# Altium footprint library heromap.PcbLib: 593 footprints (part 32 of 38)
Each footprint in its own frame and in the unit in brackets; x right, y up, seen from the top. Pads: shape width x height; smd on the part's side, far side on the other; paste and mask are expansions set on the pad; w line width, h text height; cw(c..) or ccw(c..) is an arc to the next point about the centre after c.
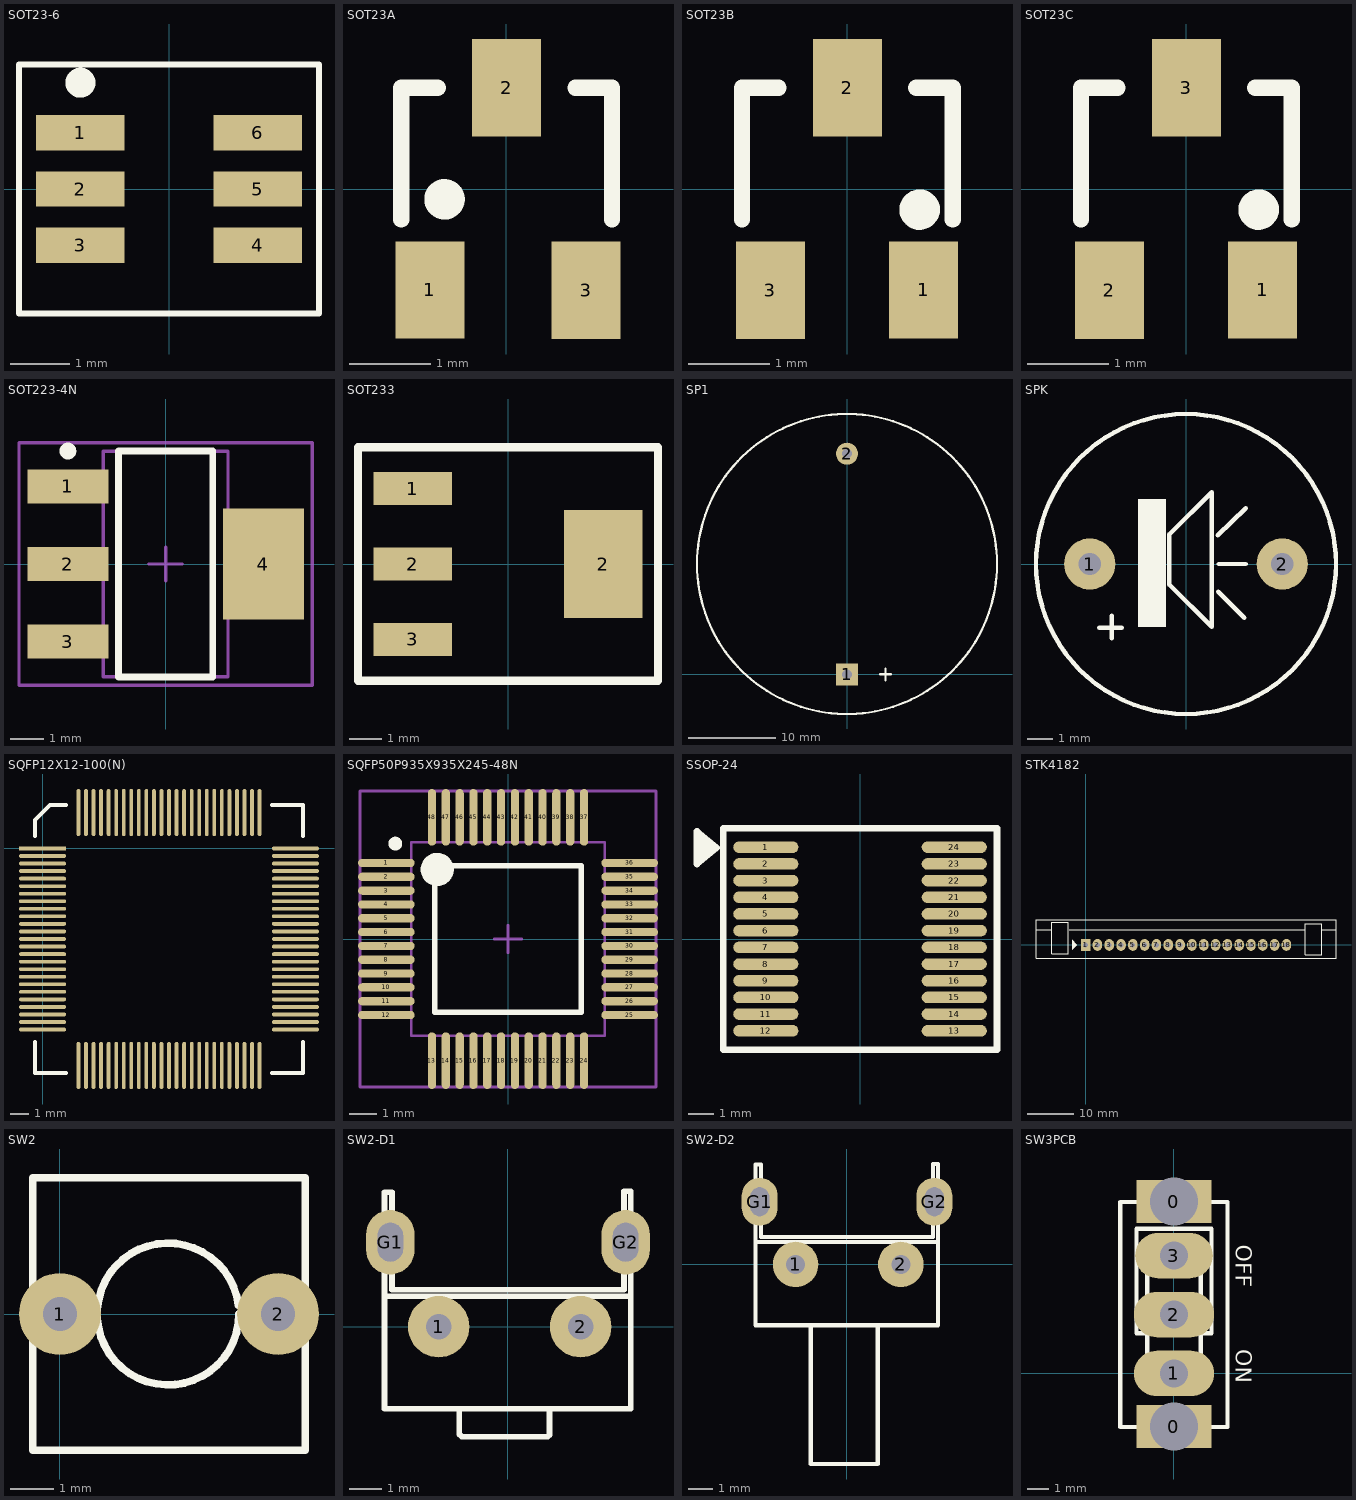
[diagram p31: the footprints below, top view; thin cyan lines are the x and y axes]

## SOT23-6 [mm] "SOT23, 5-Leads, Body 3.0x3.0mm (max), Pitch 0.95mm, IPC Medium Density"
height 1.45
pads (6):
  rect 1.5x0.6 smd: 1(-1.5,0.95) 2(-1.5,0) 3(-1.5,-0.95) 4(1.5,-0.95) 5(1.5,0) 6(1.5,0.95)
Top Overlay:
  circle w0.25: c-1.5,1.8 r0.125
  circle w0.254: c-1.5,1.8 r0.127
  lines w0.102: -2.159,2.107 1.905,2.107 ; -2.54,-2.107 2.54,-2.107 2.54,2.107 -2.54,2.107 -2.54,-2.107
3D body: height 0.15, standoff 0, extent 1.219,-0.218 1.753,0.239
3D body: height 0.9, standoff 0, extent 1.092,-0.218 1.219,0.239
3D body: height 0.9, standoff 0.75, extent 0.813,-0.218 1.092,0.239
3D body: height 0.15, standoff 0, extent -1.753,0.711 -1.219,1.168
3D body: height 0.9, standoff 0, extent -1.219,0.711 -1.092,1.168
3D body: height 0.9, standoff 0.75, extent -1.092,0.711 -0.813,1.168
3D body: height 1.45, standoff 0, extent -0.875,-1.525 0.875,1.525
3D body: height 0.9, standoff 0.75, extent -1.092,-0.239 -0.813,0.218
3D body: height 0.9, standoff 0, extent -1.219,-0.239 -1.092,0.218
3D body: height 0.15, standoff 0, extent -1.753,-0.239 -1.219,0.218
3D body: height 0.9, standoff 0.75, extent -1.092,-1.189 -0.813,-0.732
3D body: height 0.9, standoff 0, extent -1.219,-1.189 -1.092,-0.732
3D body: height 0.15, standoff 0, extent -1.753,-1.189 -1.219,-0.732
3D body: height 0.9, standoff 0.75, extent 0.813,0.732 1.092,1.189
3D body: height 0.9, standoff 0, extent 1.092,0.732 1.219,1.189
3D body: height 0.15, standoff 0, extent 1.219,0.732 1.753,1.189
3D body: height 0.9, standoff 0.75, extent 0.813,-1.168 1.092,-0.711
3D body: height 0.9, standoff 0, extent 1.092,-1.168 1.219,-0.711
3D body: height 0.15, standoff 0, extent 1.219,-1.168 1.753,-0.711

## SOT23A [mm] "SOT 23A"
height 1.27
pads (3):
  rect 0.85x1.2 smd: 1(-0.94,-1.245) 2(0.005,1.25) 3(0.985,-1.25)
Top Overlay:
  circle w0.25: c-0.76,-0.127 r0.125
  lines w0.2: -1.295,-0.375 -1.295,1.25 -0.845,1.25 ; 0.855,1.25 1.305,1.25 1.305,-0.375
3D body: height 0.15, standoff 0, extent 0.754,-1.515 1.212,-0.982
3D body: height 0.9, standoff 0, extent 0.754,-0.982 1.212,-0.855
3D body: height 0.9, standoff 0.75, extent 0.754,-0.855 1.212,-0.575
3D body: height 0.15, standoff 0, extent -1.171,-1.51 -0.714,-0.976
3D body: height 0.9, standoff 0, extent -1.171,-0.976 -0.714,-0.849
3D body: height 0.9, standoff 0.75, extent -1.171,-0.849 -0.714,-0.57
3D body: height 0.15, standoff 0, extent -0.246,0.957 0.211,1.49
3D body: height 0.9, standoff 0, extent -0.246,0.83 0.211,0.957
3D body: height 0.9, standoff 0.75, extent -0.246,0.55 0.211,0.83
3D body: height 1.27, standoff 0, extent -1.511,-0.698 1.511,0.699
3D body: height 1.27, standoff 0, extent -0.892,-0.518 -0.643,-0.269

## SOT23B [mm] "SOT 23B"
height 1.27
pads (3):
  rect 0.85x1.2 smd: 1(0.94,-1.245) 2(0,1.25) 3(-0.95,-1.25)
Top Overlay:
  circle w0.25: c0.891,-0.254 r0.125
  lines w0.2: -1.3,-0.375 -1.3,1.25 -0.85,1.25 ; 0.85,1.25 1.3,1.25 1.3,-0.375
3D body: height 1.27, standoff 0, extent -0.892,-0.518 -0.643,-0.269
3D body: height 1.27, standoff 0, extent -1.511,-0.698 1.511,0.699
3D body: height 0.9, standoff 0.75, extent -0.246,0.55 0.211,0.83
3D body: height 0.9, standoff 0, extent -0.246,0.83 0.211,0.957
3D body: height 0.15, standoff 0, extent -0.246,0.957 0.211,1.49
3D body: height 0.9, standoff 0.75, extent -1.171,-0.849 -0.714,-0.57
3D body: height 0.9, standoff 0, extent -1.171,-0.976 -0.714,-0.849
3D body: height 0.15, standoff 0, extent -1.171,-1.51 -0.714,-0.976
3D body: height 0.9, standoff 0.75, extent 0.754,-0.855 1.212,-0.575
3D body: height 0.9, standoff 0, extent 0.754,-0.982 1.212,-0.855
3D body: height 0.15, standoff 0, extent 0.754,-1.515 1.212,-0.982

## SOT23C [mm] "SOT 23C - 2-3-1 - BCE"
height 1.27
pads (3):
  rect 0.85x1.2 smd: 1(0.94,-1.245) 2(-0.95,-1.25) 3(0,1.25)
Top Overlay:
  circle w0.25: c0.891,-0.254 r0.125
  lines w0.2: -1.3,-0.375 -1.3,1.25 -0.85,1.25 ; 0.85,1.25 1.3,1.25 1.3,-0.375
3D body: height 1.27, standoff 0, extent -0.892,-0.518 -0.643,-0.269
3D body: height 1.27, standoff 0, extent -1.511,-0.698 1.511,0.699
3D body: height 0.9, standoff 0.75, extent -0.246,0.55 0.211,0.83
3D body: height 0.9, standoff 0, extent -0.246,0.83 0.211,0.957
3D body: height 0.15, standoff 0, extent -0.246,0.957 0.211,1.49
3D body: height 0.9, standoff 0.75, extent -1.171,-0.849 -0.714,-0.57
3D body: height 0.9, standoff 0, extent -1.171,-0.976 -0.714,-0.849
3D body: height 0.15, standoff 0, extent -1.171,-1.51 -0.714,-0.976
3D body: height 0.9, standoff 0.75, extent 0.754,-0.855 1.212,-0.575
3D body: height 0.9, standoff 0, extent 0.754,-0.982 1.212,-0.855
3D body: height 0.15, standoff 0, extent 0.754,-1.515 1.212,-0.982

## SOT223-4N [mm] "SOT223, 4-Leads, Body 6.5x3.5mm, Pitch 2.3mm, Lead Span 7mm, IPC Medium Density"
height 1.8
pads (4):
  rect 2.4x1 smd: 1(-2.9,2.3) 2(-2.9,0) 3(-2.9,-2.3)
  rect 2.4x3.3 smd: 4(2.9,0)
Top Overlay:
  circle w0.25: c-2.9,3.35 r0.125
  lines w0.2: -1.4,-3.35 -1.4,3.35 1.4,3.35 1.4,-3.35 -1.4,-3.35
Mechanical 13:
  lines w0.1: -1.85,-3.35 -1.85,3.35 1.85,3.35 1.85,-3.35 -1.85,-3.35
Mechanical 15:
  lines w0.1: -0.5,0 0.5,0 ; 0,-0.5 0,0.5 ; -4.35,-3.6 -4.35,3.6 4.35,3.6 4.35,-3.6 -4.35,-3.6
3D body: height 1.8, standoff 0, extent -1.85,-3.35 1.85,3.35

## SOT233 [mm]
pads (4):
  rect 2.4x1 smd: 1(-2.9,2.3) 2(-2.9,0) 3(-2.9,-2.3)
  rect 2.4x3.3 smd: 2(2.9,0)
Top Overlay:
  lines w0.254: -4.572,-3.556 4.572,-3.556 4.572,3.556 -4.572,3.556 -4.572,-3.556
3D body: height 1, standoff 0.02, extent -1.85,-3.35 1.85,3.35
3D body: height 0.4, standoff 0.15, extent -2.286,-2.807 -1.422,-1.816
3D body: height 0.4, standoff 0, extent -2.591,-2.807 -2.286,-1.816
3D body: height 0.2, standoff 0, extent -3.81,-2.807 -2.591,-1.816
3D body: height 0.4, standoff 0.15, extent -2.286,-0.495 -1.422,0.495
3D body: height 0.4, standoff 0, extent -2.591,-0.495 -2.286,0.495
3D body: height 0.2, standoff 0, extent -3.81,-0.495 -2.591,0.495
3D body: height 0.2, standoff 0, extent -3.81,1.803 -2.591,2.794
3D body: height 0.4, standoff 0, extent -2.591,1.803 -2.286,2.794
3D body: height 0.4, standoff 0.15, extent -2.286,1.803 -1.422,2.794
3D body: height 0.4, standoff 0.15, extent 1.422,-1.626 2.388,1.651
3D body: height 0.4, standoff 0, extent 2.388,-1.626 2.54,1.651
3D body: height 0.2, standoff 0, extent 2.54,-1.626 3.556,1.651

## SP1 [mil] "Speaker Telphone on Broad"
height 3
pads (2):
  rect 100x100 hole 45: 1(0,0)
  round 100 hole 45: 2(0,1000)
Top Overlay:
  circle w10: c0,500 r680
  lines w10: 150,0 200,0 ; 174,-28 174,26

## SPK [mil] "Speaker Chip"
height 500
pads (2):
  round 80 hole 35: 1(-150,0) 2(150,0)
Top Overlay:
  circle w7: c0,0 r233.73
  rectangle: -75,-98 -31,101
  lines w7: -135,-99 -100,-99 ; -116,-116 -116,-81 ; 49.52,44.52 93,87 ; 50,-43 91,-84 ; 51,0 93,0 ; -26,-32 40,-98 40,112 -26,46 -26,-32
3D body: height 11.81, standoff -94.49, extent 134.38,-15.72 165.75,15.72
3D body: height 11.81, standoff -94.49, extent -165.62,-15.71 -134.25,15.73
3D body: height 362.2, standoff 7.87, extent -214.82,-216.1 216.54,216.12
3D body: height 362.6, standoff 7.87, extent -78.11,-78.58 78.75,78.59

## SQFP12X12-100(N) [mm]
pads (100):
  rect 2.5x0.2 smd: 1(0,0)
  oval 2.5x0.2 smd: 2(0,-0.4) 3(0,-0.8) 4(0,-1.2) 5(0,-1.6) 6(0,-2) 7(0,-2.4) 8(0,-2.8) 9(0,-3.2) 10(0,-3.6) 11(0,-4) 12(0,-4.4) 13(0,-4.8) 14(0,-5.2) 15(0,-5.6) 16(0,-6) 17(0,-6.4) 18(0,-6.8) 19(0,-7.2) 20(0,-7.6) 21(0,-8) 22(0,-8.4) 23(0,-8.8) 24(0,-9.2) 25(0,-9.6) 51(13.4,-9.6) 52(13.4,-9.2) 53(13.4,-8.8) 54(13.4,-8.4) 55(13.4,-8) 56(13.4,-7.6) 57(13.4,-7.2) 58(13.4,-6.8) 59(13.4,-6.4) 60(13.4,-6) 61(13.4,-5.6) 62(13.4,-5.2) 63(13.4,-4.8) 64(13.4,-4.4) 65(13.4,-4) 66(13.4,-3.6) 67(13.4,-3.2) 68(13.4,-2.8) 69(13.4,-2.4) 70(13.4,-2) 71(13.4,-1.6) 72(13.4,-1.2) 73(13.4,-0.8) 74(13.4,-0.4) 75(13.4,0)
  oval 0.2x2.5 smd: 26(1.9,-11.5) 27(2.3,-11.5) 28(2.7,-11.5) 29(3.1,-11.5) 30(3.5,-11.5) 31(3.9,-11.5) 32(4.3,-11.5) 33(4.7,-11.5) 34(5.1,-11.5) 35(5.5,-11.5) 36(5.9,-11.5) 37(6.3,-11.5) 38(6.7,-11.5) 39(7.1,-11.5) 40(7.5,-11.5) 41(7.9,-11.5) 42(8.3,-11.5) 43(8.7,-11.5) 44(9.1,-11.5) 45(9.5,-11.5) 46(9.9,-11.5) 47(10.3,-11.5) 48(10.7,-11.5) 49(11.1,-11.5) 50(11.5,-11.5) 76(11.5,1.9) 77(11.1,1.9) 78(10.7,1.9) 79(10.3,1.9) 80(9.9,1.9) 81(9.5,1.9) 82(9.1,1.9) 83(8.7,1.9) 84(8.3,1.9) 85(7.9,1.9) 86(7.5,1.9) 87(7.1,1.9) 88(6.7,1.9) 89(6.3,1.9) 90(5.9,1.9) 91(5.5,1.9) 92(5.1,1.9) 93(4.7,1.9) 94(4.3,1.9) 95(3.9,1.9) 96(3.5,1.9) 97(3.1,1.9) 98(2.7,1.9) 99(2.3,1.9) 100(1.9,1.9)
Top Overlay:
  lines w0.2: -0.4,-10.25 -0.4,-11.9 1.25,-11.9 ; -0.4,0.65 -0.4,1.5 0.4,2.3 1.25,2.3 ; 12.15,-11.9 13.8,-11.9 13.8,-10.25 ; 12.15,2.3 13.8,2.3 13.8,0.65

## SQFP50P935X935X245-48N [mm] "SQFP, 48-Leads, Body 9,5x9,5mm (max), Pitch 0,50mm, IPC Medium Density"
height 2.45
pads (48):
  oval 2.05x0.3 smd: 1(-4.4,2.75) 2(-4.4,2.25) 3(-4.4,1.75) 4(-4.4,1.25) 5(-4.4,0.75) 6(-4.4,0.25) 7(-4.4,-0.25) 8(-4.4,-0.75) 9(-4.4,-1.25) 10(-4.4,-1.75) 11(-4.4,-2.25) 12(-4.4,-2.75) 25(4.4,-2.75) 26(4.4,-2.25) 27(4.4,-1.75) 28(4.4,-1.25) 29(4.4,-0.75) 30(4.4,-0.25) 31(4.4,0.25) 32(4.4,0.75) 33(4.4,1.25) 34(4.4,1.75) 35(4.4,2.25) 36(4.4,2.75)
  oval 0.3x2.05 smd: 13(-2.75,-4.4) 14(-2.25,-4.4) 15(-1.75,-4.4) 16(-1.25,-4.4) 17(-0.75,-4.4) 18(-0.25,-4.4) 19(0.25,-4.4) 20(0.75,-4.4) 21(1.25,-4.4) 22(1.75,-4.4) 23(2.25,-4.4) 24(2.75,-4.4) 37(2.75,4.4) 38(2.25,4.4) 39(1.75,4.4) 40(1.25,4.4) 41(0.75,4.4) 42(0.25,4.4) 43(-0.25,4.4) 44(-0.75,4.4) 45(-1.25,4.4) 46(-1.75,4.4) 47(-2.25,4.4) 48(-2.75,4.4)
Top Overlay:
  circle w0.25: c-4.075,3.45 r0.125
  circle w0.6: c-2.561,2.515 r0.3
  lines w0.2: -2.65,-2.65 -2.65,2.65 2.65,2.65 2.65,-2.65 -2.65,-2.65
Mechanical 13:
  circle w0.1: c-2.55,2.55 r0.5
  lines w0.1: -3.5,-3.5 -3.5,3.5 3.5,3.5 3.5,-3.5 -3.5,-3.5
Mechanical 15:
  lines w0.1: -0.5,0 0.5,0 ; 0,-0.5 0,0.5 ; -5.35,-5.35 -5.35,5.35 5.35,5.35 5.35,-5.35 -5.35,-5.35
3D body: height 2.45, standoff 0.25, extent -3.5,-3.5 3.5,3.5
3D body: height 0.15, standoff 0, extent -4.756,2.61 -4.044,2.89
3D body: height 1.25, standoff 1.1, extent -4.166,2.61 -3.454,2.89
3D body: height 1.25, standoff 0, extent -4.166,2.61 -4.044,2.89
3D body: height 1.25, standoff 0, extent -4.166,2.11 -4.044,2.39
3D body: height 1.25, standoff 1.1, extent -4.166,2.11 -3.454,2.39
3D body: height 0.15, standoff 0, extent -4.756,2.11 -4.044,2.39
3D body: height 1.25, standoff 0, extent -4.166,1.61 -4.044,1.89
3D body: height 1.25, standoff 1.1, extent -4.166,1.61 -3.454,1.89
3D body: height 0.15, standoff 0, extent -4.756,1.61 -4.044,1.89
3D body: height 0.15, standoff 0, extent -4.756,0.11 -4.044,0.39
3D body: height 1.25, standoff 1.1, extent -4.166,0.11 -3.454,0.39
3D body: height 1.25, standoff 0, extent -4.166,0.11 -4.044,0.39
3D body: height 0.15, standoff 0, extent -4.756,0.61 -4.044,0.89
3D body: height 1.25, standoff 1.1, extent -4.166,0.61 -3.454,0.89
3D body: height 1.25, standoff 0, extent -4.166,0.61 -4.044,0.89
3D body: height 1.25, standoff 0, extent -4.166,1.11 -4.044,1.39
3D body: height 1.25, standoff 1.1, extent -4.166,1.11 -3.454,1.39
3D body: height 0.15, standoff 0, extent -4.756,1.11 -4.044,1.39
3D body: height 0.15, standoff 0, extent -4.756,-1.39 -4.044,-1.11
3D body: height 1.25, standoff 1.1, extent -4.166,-1.39 -3.454,-1.11
3D body: height 1.25, standoff 0, extent -4.166,-1.39 -4.044,-1.11
3D body: height 0.15, standoff 0, extent -4.756,-0.89 -4.044,-0.61
3D body: height 1.25, standoff 1.1, extent -4.166,-0.89 -3.454,-0.61
3D body: height 1.25, standoff 0, extent -4.166,-0.89 -4.044,-0.61
3D body: height 1.25, standoff 0, extent -4.166,-0.39 -4.044,-0.11
3D body: height 1.25, standoff 1.1, extent -4.166,-0.39 -3.454,-0.11
3D body: height 0.15, standoff 0, extent -4.756,-0.39 -4.044,-0.11
3D body: height 0.15, standoff 0, extent -4.756,-2.89 -4.044,-2.61
3D body: height 1.25, standoff 1.1, extent -4.166,-2.89 -3.454,-2.61
3D body: height 1.25, standoff 0, extent -4.166,-2.89 -4.044,-2.61
3D body: height 0.15, standoff 0, extent -4.756,-2.39 -4.044,-2.11
3D body: height 1.25, standoff 1.1, extent -4.166,-2.39 -3.454,-2.11
3D body: height 1.25, standoff 0, extent -4.166,-2.39 -4.044,-2.11
3D body: height 1.25, standoff 0, extent -4.166,-1.89 -4.044,-1.61
3D body: height 1.25, standoff 1.1, extent -4.166,-1.89 -3.454,-1.61
3D body: height 0.15, standoff 0, extent -4.756,-1.89 -4.044,-1.61
3D body: height 0.15, standoff 0, extent 1.61,-4.756 1.89,-4.044
3D body: height 1.25, standoff 1.1, extent 1.61,-4.166 1.89,-3.454
3D body: height 1.25, standoff 0, extent 1.61,-4.166 1.89,-4.044
3D body: height 1.25, standoff 0, extent 2.11,-4.166 2.39,-4.044
3D body: height 1.25, standoff 1.1, extent 2.11,-4.166 2.39,-3.454
3D body: height 0.15, standoff 0, extent 2.11,-4.756 2.39,-4.044
3D body: height 1.25, standoff 0, extent 2.61,-4.166 2.89,-4.044
3D body: height 1.25, standoff 1.1, extent 2.61,-4.166 2.89,-3.454
3D body: height 0.15, standoff 0, extent 2.61,-4.756 2.89,-4.044
3D body: height 0.15, standoff 0, extent 0.11,-4.756 0.39,-4.044
3D body: height 1.25, standoff 1.1, extent 0.11,-4.166 0.39,-3.454
3D body: height 1.25, standoff 0, extent 0.11,-4.166 0.39,-4.044
3D body: height 1.25, standoff 0, extent 0.61,-4.166 0.89,-4.044
3D body: height 1.25, standoff 1.1, extent 0.61,-4.166 0.89,-3.454
3D body: height 0.15, standoff 0, extent 0.61,-4.756 0.89,-4.044
3D body: height 1.25, standoff 0, extent 1.11,-4.166 1.39,-4.044
3D body: height 1.25, standoff 1.1, extent 1.11,-4.166 1.39,-3.454
3D body: height 0.15, standoff 0, extent 1.11,-4.756 1.39,-4.044
3D body: height 0.15, standoff 0, extent -1.39,-4.756 -1.11,-4.044
3D body: height 1.25, standoff 1.1, extent -1.39,-4.166 -1.11,-3.454
3D body: height 1.25, standoff 0, extent -1.39,-4.166 -1.11,-4.044
3D body: height 1.25, standoff 0, extent -0.89,-4.166 -0.61,-4.044
3D body: height 1.25, standoff 1.1, extent -0.89,-4.166 -0.61,-3.454
3D body: height 0.15, standoff 0, extent -0.89,-4.756 -0.61,-4.044
3D body: height 1.25, standoff 0, extent -0.39,-4.166 -0.11,-4.044
3D body: height 1.25, standoff 1.1, extent -0.39,-4.166 -0.11,-3.454
3D body: height 0.15, standoff 0, extent -0.39,-4.756 -0.11,-4.044
3D body: height 0.15, standoff 0, extent -1.89,-4.756 -1.61,-4.044
3D body: height 1.25, standoff 1.1, extent -1.89,-4.166 -1.61,-3.454
3D body: height 1.25, standoff 0, extent -1.89,-4.166 -1.61,-4.044
3D body: height 0.15, standoff 0, extent -2.39,-4.756 -2.11,-4.044
3D body: height 1.25, standoff 1.1, extent -2.39,-4.166 -2.11,-3.454
3D body: height 1.25, standoff 0, extent -2.39,-4.166 -2.11,-4.044
3D body: height 1.25, standoff 0, extent -2.89,-4.166 -2.61,-4.044
3D body: height 1.25, standoff 1.1, extent -2.89,-4.166 -2.61,-3.454
3D body: height 0.15, standoff 0, extent -2.89,-4.756 -2.61,-4.044
3D body: height 0.15, standoff 0, extent 4.07,1.61 4.781,1.89
3D body: height 1.25, standoff 1.1, extent 3.48,1.61 4.191,1.89
3D body: height 1.25, standoff 0, extent 4.07,1.61 4.191,1.89
3D body: height 1.25, standoff 0, extent 4.07,2.11 4.191,2.39
3D body: height 1.25, standoff 1.1, extent 3.48,2.11 4.191,2.39
3D body: height 0.15, standoff 0, extent 4.07,2.11 4.781,2.39
3D body: height 1.25, standoff 0, extent 4.07,2.61 4.191,2.89
3D body: height 1.25, standoff 1.1, extent 3.48,2.61 4.191,2.89
3D body: height 0.15, standoff 0, extent 4.07,2.61 4.781,2.89
3D body: height 0.15, standoff 0, extent 4.07,0.11 4.781,0.39
3D body: height 1.25, standoff 1.1, extent 3.48,0.11 4.191,0.39
3D body: height 1.25, standoff 0, extent 4.07,0.11 4.191,0.39
3D body: height 1.25, standoff 0, extent 4.07,0.61 4.191,0.89
3D body: height 1.25, standoff 1.1, extent 3.48,0.61 4.191,0.89
3D body: height 0.15, standoff 0, extent 4.07,0.61 4.781,0.89
3D body: height 1.25, standoff 0, extent 4.07,1.11 4.191,1.39
3D body: height 1.25, standoff 1.1, extent 3.48,1.11 4.191,1.39
3D body: height 0.15, standoff 0, extent 4.07,1.11 4.781,1.39
3D body: height 0.15, standoff 0, extent 4.07,-1.39 4.781,-1.11
3D body: height 1.25, standoff 1.1, extent 3.48,-1.39 4.191,-1.11
3D body: height 1.25, standoff 0, extent 4.07,-1.39 4.191,-1.11
3D body: height 1.25, standoff 0, extent 4.07,-0.89 4.191,-0.61
3D body: height 1.25, standoff 1.1, extent 3.48,-0.89 4.191,-0.61
3D body: height 0.15, standoff 0, extent 4.07,-0.89 4.781,-0.61
3D body: height 1.25, standoff 0, extent 4.07,-0.39 4.191,-0.11
3D body: height 1.25, standoff 1.1, extent 3.48,-0.39 4.191,-0.11
3D body: height 0.15, standoff 0, extent 4.07,-0.39 4.781,-0.11
3D body: height 0.15, standoff 0, extent 4.07,-1.89 4.781,-1.61
3D body: height 1.25, standoff 1.1, extent 3.48,-1.89 4.191,-1.61
3D body: height 1.25, standoff 0, extent 4.07,-1.89 4.191,-1.61
3D body: height 0.15, standoff 0, extent 4.07,-2.39 4.781,-2.11
3D body: height 1.25, standoff 1.1, extent 3.48,-2.39 4.191,-2.11
3D body: height 1.25, standoff 0, extent 4.07,-2.39 4.191,-2.11
3D body: height 1.25, standoff 0, extent 4.07,-2.89 4.191,-2.61
3D body: height 1.25, standoff 1.1, extent 3.48,-2.89 4.191,-2.61
3D body: height 0.15, standoff 0, extent 4.07,-2.89 4.781,-2.61
3D body: height 0.15, standoff 0, extent -1.896,4.09 -1.617,4.801
3D body: height 1.25, standoff 1.1, extent -1.897,3.5 -1.617,4.211
3D body: height 1.25, standoff 0, extent -1.897,4.09 -1.617,4.211
3D body: height 1.25, standoff 0, extent -2.397,4.09 -2.117,4.211
3D body: height 1.25, standoff 1.1, extent -2.397,3.5 -2.117,4.211
3D body: height 0.15, standoff 0, extent -2.396,4.09 -2.117,4.801
3D body: height 1.25, standoff 0, extent -2.897,4.09 -2.617,4.211
3D body: height 1.25, standoff 1.1, extent -2.897,3.5 -2.617,4.211
3D body: height 0.15, standoff 0, extent -2.896,4.09 -2.617,4.801
3D body: height 0.15, standoff 0, extent -0.396,4.09 -0.117,4.801
3D body: height 1.25, standoff 1.1, extent -0.397,3.5 -0.117,4.211
3D body: height 1.25, standoff 0, extent -0.397,4.09 -0.117,4.211
3D body: height 1.25, standoff 0, extent -0.897,4.09 -0.617,4.211
3D body: height 1.25, standoff 1.1, extent -0.897,3.5 -0.617,4.211
3D body: height 0.15, standoff 0, extent -0.896,4.09 -0.617,4.801
3D body: height 1.25, standoff 0, extent -1.397,4.09 -1.117,4.211
3D body: height 1.25, standoff 1.1, extent -1.397,3.5 -1.117,4.211
3D body: height 0.15, standoff 0, extent -1.396,4.09 -1.117,4.801
3D body: height 0.15, standoff 0, extent 1.104,4.09 1.383,4.801
3D body: height 1.25, standoff 1.1, extent 1.103,3.5 1.383,4.211
3D body: height 1.25, standoff 0, extent 1.103,4.09 1.383,4.211
3D body: height 1.25, standoff 0, extent 0.603,4.09 0.883,4.211
3D body: height 1.25, standoff 1.1, extent 0.603,3.5 0.883,4.211
3D body: height 0.15, standoff 0, extent 0.604,4.09 0.883,4.801
3D body: height 1.25, standoff 0, extent 0.103,4.09 0.383,4.211
3D body: height 1.25, standoff 1.1, extent 0.103,3.5 0.383,4.211
3D body: height 0.15, standoff 0, extent 0.104,4.09 0.383,4.801
3D body: height 0.15, standoff 0, extent 1.604,4.09 1.883,4.801
3D body: height 1.25, standoff 1.1, extent 1.603,3.5 1.883,4.211
3D body: height 1.25, standoff 0, extent 1.603,4.09 1.883,4.211
3D body: height 0.15, standoff 0, extent 2.104,4.09 2.383,4.801
3D body: height 1.25, standoff 1.1, extent 2.103,3.5 2.383,4.211
3D body: height 1.25, standoff 0, extent 2.103,4.09 2.383,4.211
3D body: height 1.25, standoff 0, extent 2.603,4.09 2.883,4.211
3D body: height 1.25, standoff 1.1, extent 2.603,3.5 2.883,4.211
3D body: height 0.15, standoff 0, extent 2.604,4.09 2.883,4.801

## SSOP-24 [mm]
pads (24):
  oval 2.54x0.45 smd: 1(-3.67,3.575) 2(-3.67,2.925) 3(-3.67,2.275) 4(-3.67,1.625) 5(-3.67,0.975) 6(-3.67,0.325) 7(-3.67,-0.325) 8(-3.67,-0.975) 9(-3.67,-1.625) 10(-3.67,-2.275) 11(-3.67,-2.925) 12(-3.67,-3.575) 13(3.67,-3.575) 14(3.67,-2.925) 15(3.67,-2.275) 16(3.67,-1.625) 17(3.67,-0.975) 18(3.67,-0.325) 19(3.67,0.325) 20(3.67,0.975) 21(3.67,1.625) 22(3.67,2.275) 23(3.67,2.925) 24(3.67,3.575)
Top Overlay:
  region: -5.588,3.556 -6.35,4.191 -6.35,2.921
  lines w0.254: -6.35,2.921 -5.588,3.556 -6.35,4.191 -6.35,2.921 ; -5.334,-4.318 5.334,-4.318 5.334,4.318 -5.334,4.318 -5.334,-4.318
3D body: height 2, standoff 0.05, extent -2.8,-4.25 2.8,4.25
3D body: height 1.05, standoff 0.95, extent -3.2,3.384 -2.286,3.765
3D body: height 1.05, standoff 0, extent -3.327,3.384 -3.2,3.765
3D body: height 0.1, standoff 0, extent -4.064,3.384 -3.327,3.765
3D body: height 0.1, standoff 0, extent -4.064,2.734 -3.327,3.115
3D body: height 1.05, standoff 0, extent -3.327,2.734 -3.2,3.115
3D body: height 1.05, standoff 0.95, extent -3.2,2.734 -2.286,3.115
3D body: height 0.1, standoff 0, extent -4.064,2.084 -3.327,2.465
3D body: height 1.05, standoff 0, extent -3.327,2.084 -3.2,2.465
3D body: height 1.05, standoff 0.95, extent -3.2,2.084 -2.286,2.465
3D body: height 0.1, standoff 0, extent -4.064,1.434 -3.327,1.815
3D body: height 1.05, standoff 0, extent -3.327,1.434 -3.2,1.815
3D body: height 1.05, standoff 0.95, extent -3.2,1.434 -2.286,1.815
3D body: height 0.1, standoff 0, extent -4.064,0.784 -3.327,1.165
3D body: height 1.05, standoff 0, extent -3.327,0.784 -3.2,1.165
3D body: height 1.05, standoff 0.95, extent -3.2,0.784 -2.286,1.165
3D body: height 0.1, standoff 0, extent -4.064,0.134 -3.327,0.515
3D body: height 1.05, standoff 0, extent -3.327,0.134 -3.2,0.515
3D body: height 1.05, standoff 0.95, extent -3.2,0.134 -2.286,0.515
3D body: height 0.1, standoff 0, extent -4.064,-0.516 -3.327,-0.135
3D body: height 1.05, standoff 0, extent -3.327,-0.516 -3.2,-0.135
3D body: height 1.05, standoff 0.95, extent -3.2,-0.516 -2.286,-0.135
3D body: height 0.1, standoff 0, extent -4.064,-1.165 -3.327,-0.784
3D body: height 1.05, standoff 0, extent -3.327,-1.165 -3.2,-0.784
3D body: height 1.05, standoff 0.95, extent -3.2,-1.165 -2.286,-0.784
3D body: height 0.1, standoff 0, extent -4.064,-1.816 -3.327,-1.435
3D body: height 1.05, standoff 0, extent -3.327,-1.816 -3.2,-1.435
3D body: height 1.05, standoff 0.95, extent -3.2,-1.816 -2.286,-1.435
3D body: height 0.1, standoff 0, extent -4.064,-2.466 -3.327,-2.085
3D body: height 1.05, standoff 0, extent -3.327,-2.466 -3.2,-2.085
3D body: height 1.05, standoff 0.95, extent -3.2,-2.466 -2.286,-2.085
3D body: height 0.1, standoff 0, extent -4.064,-3.116 -3.327,-2.735
3D body: height 1.05, standoff 0, extent -3.327,-3.116 -3.2,-2.735
3D body: height 1.05, standoff 0.95, extent -3.2,-3.116 -2.286,-2.735
3D body: height 0.1, standoff 0, extent -4.064,-3.765 -3.327,-3.384
3D body: height 1.05, standoff 0, extent -3.327,-3.765 -3.2,-3.384
3D body: height 1.05, standoff 0.95, extent -3.2,-3.765 -2.286,-3.384
3D body: height 1.05, standoff 0.95, extent 2.286,3.384 3.2,3.765
3D body: height 1.05, standoff 0, extent 3.2,3.384 3.327,3.765
3D body: height 0.1, standoff 0, extent 3.327,3.384 4.064,3.765
3D body: height 1.05, standoff 0.95, extent 2.286,2.735 3.2,3.116
3D body: height 1.05, standoff 0, extent 3.2,2.735 3.327,3.116
3D body: height 0.1, standoff 0, extent 3.327,2.735 4.064,3.116
3D body: height 1.05, standoff 0.95, extent 2.286,2.085 3.2,2.466
3D body: height 1.05, standoff 0, extent 3.2,2.085 3.327,2.466
3D body: height 0.1, standoff 0, extent 3.327,2.085 4.064,2.466
3D body: height 1.05, standoff 0.95, extent 2.286,1.435 3.2,1.816
3D body: height 1.05, standoff 0, extent 3.2,1.435 3.327,1.816
3D body: height 0.1, standoff 0, extent 3.327,1.435 4.064,1.816
3D body: height 1.05, standoff 0.95, extent 2.286,0.784 3.2,1.165
3D body: height 1.05, standoff 0, extent 3.2,0.784 3.327,1.165
3D body: height 0.1, standoff 0, extent 3.327,0.784 4.064,1.165
3D body: height 1.05, standoff 0.95, extent 2.286,0.135 3.2,0.516
3D body: height 1.05, standoff 0, extent 3.2,0.135 3.327,0.516
3D body: height 0.1, standoff 0, extent 3.327,0.135 4.064,0.516
3D body: height 1.05, standoff 0.95, extent 2.286,-0.515 3.2,-0.134
3D body: height 1.05, standoff 0, extent 3.2,-0.515 3.327,-0.134
3D body: height 0.1, standoff 0, extent 3.327,-0.515 4.064,-0.134
3D body: height 1.05, standoff 0.95, extent 2.286,-1.165 3.2,-0.784
3D body: height 1.05, standoff 0, extent 3.2,-1.165 3.327,-0.784
3D body: height 0.1, standoff 0, extent 3.327,-1.165 4.064,-0.784
3D body: height 1.05, standoff 0.95, extent 2.286,-1.815 3.2,-1.434
3D body: height 1.05, standoff 0, extent 3.2,-1.815 3.327,-1.434
3D body: height 0.1, standoff 0, extent 3.327,-1.815 4.064,-1.434
3D body: height 1.05, standoff 0.95, extent 2.286,-2.465 3.2,-2.084
3D body: height 1.05, standoff 0, extent 3.2,-2.465 3.327,-2.084
3D body: height 0.1, standoff 0, extent 3.327,-2.465 4.064,-2.084
3D body: height 1.05, standoff 0.95, extent 2.286,-3.115 3.2,-2.734
3D body: height 1.05, standoff 0, extent 3.2,-3.115 3.327,-2.734
3D body: height 0.1, standoff 0, extent 3.327,-3.115 4.064,-2.734
3D body: height 0.1, standoff 0, extent 3.327,-3.765 4.064,-3.384
3D body: height 1.05, standoff 0, extent 3.2,-3.765 3.327,-3.384
3D body: height 1.05, standoff 0.95, extent 2.286,-3.765 3.2,-3.384
3D body: height 2.01, standoff 0, extent -2.304,3.036 -1.286,4.054

## STK4182 [mil] "Pin to pin 100mil, 18 pin"
pads (18):
  rect 80x100 hole 40: 1(0,0)
  oval 80x100 hole 40: 2(100,0) 3(200,0) 4(300,0) 5(400,0) 6(500,0) 7(600,0) 8(700,0) 9(800,0) 10(900,0) 11(1000,0) 12(1100,0) 13(1200,0) 14(1300,0) 15(1400,0) 16(1500,0) 17(1600,0) 18(1700,0)
Top Overlay:
  region: -115,42.5 -115,-42.5 -75,-2.5 -75,2.5
  lines w10: -420,130 -285,130 ; -140,130 1860,130 ; 2000,130 2120,130 ; -420,-115 -420,215 2120,215 2120,-115 -420,-115 ; -285,-75 -145,-75 -145,190 -285,190 -285,-75 ; 1860,-85 1860,180 2000,180 2000,-85 1860,-85

## SW2 [mil] "SW button 2pin, 250x 250 mil"
height 100
pads (2):
  round 75 hole 31: 1(0,0) 2(200,0)
Top Overlay:
  lines w7: 163.64,8.26 ccw(c99.17,0) 164.17,0 ; -25,-125 -25,125 225,125 225,-125 -25,-125
3D body "19978.stp": height 196.85, standoff -551.18, extent -18.1,-116.1 218.12,127.99

## SW2-D1 [mil] "SW button 2pin, 300x 300 x 250 mil"
height 100
pads (4):
  round 75 hole 31: 1(-84,0) 2(89,0)
  oval 59.06x78.74 hole 31 slot 47.24 at 90 deg: G1(-143,103) G2(144,103)
Top Overlay:
  lines w7: -150,37 150,37 ; -59,-100 -59,-131 -56,-134 49,-134 51,-132 51,-100 ; -150,-100 150,-100 150,165 142,165 142,45 -141,45 -141,164 -150,164 -150,-100
3D body "19950.stp": height 291.34, standoff -137.8, extent -170.26,-123 172.26,158.5

## SW2-D2 [mil] "SW button 2pin, 300x 300 x 250 mil"
height 100
pads (4):
  round 75 hole 31: 1(-84,0) 2(89,0)
  oval 59.06x78.74 hole 31 slot 47.24 at 90 deg: G1(-143,103) G2(144,103)
Top Overlay:
  lines w7: -150,37 150,37 ; -59,-100 -59,-328 51,-328 51,-100 ; -150,-100 -150,164 -141,164 -141,45 142,45 142,165 150,165 150,-100 -150,-100
3D body "SW3dPS-Alps TACT SKHH Horizontal Switch.STEP": height 290.35, standoff -137.8, extent -162.52,-327.46 166.72,163.49

## SW3PCB [mil]
pads (5):
  rect 140x80 hole 90: 0(0,-99) 0(0,321)
  oval 150x85 hole 52: 1(0,0) 2(0,110)
  oval 145x85 hole 52: 3(0,220)
Top Overlay:
  lines w8: -70,90 70,90 ; -70,120 65,120 ; -65,105 70,105 ; -50,0 -50,220 50,220 50,0 ; -50,0 50,0 ; -50,0 50,0 ; -100,-100 -100,320 100,320 100,-100 -100,-100 ; -70,75 -70,270 70,270 70,75 -70,75
  text "OFF" at 115,240 h30
  text "ON" at 115,45 h30